# Altium footprint library ESKDPcbLib.PcbLib: 608 footprints (part 19 of 38)
Each footprint in its own frame and in the unit in brackets; x right, y up, seen from the top. Pads: shape width x height; smd on the part's side, far side on the other; paste and mask are expansions set on the pad; w line width, h text height; cw(c..) or ccw(c..) is an arc to the next point about the centre after c.
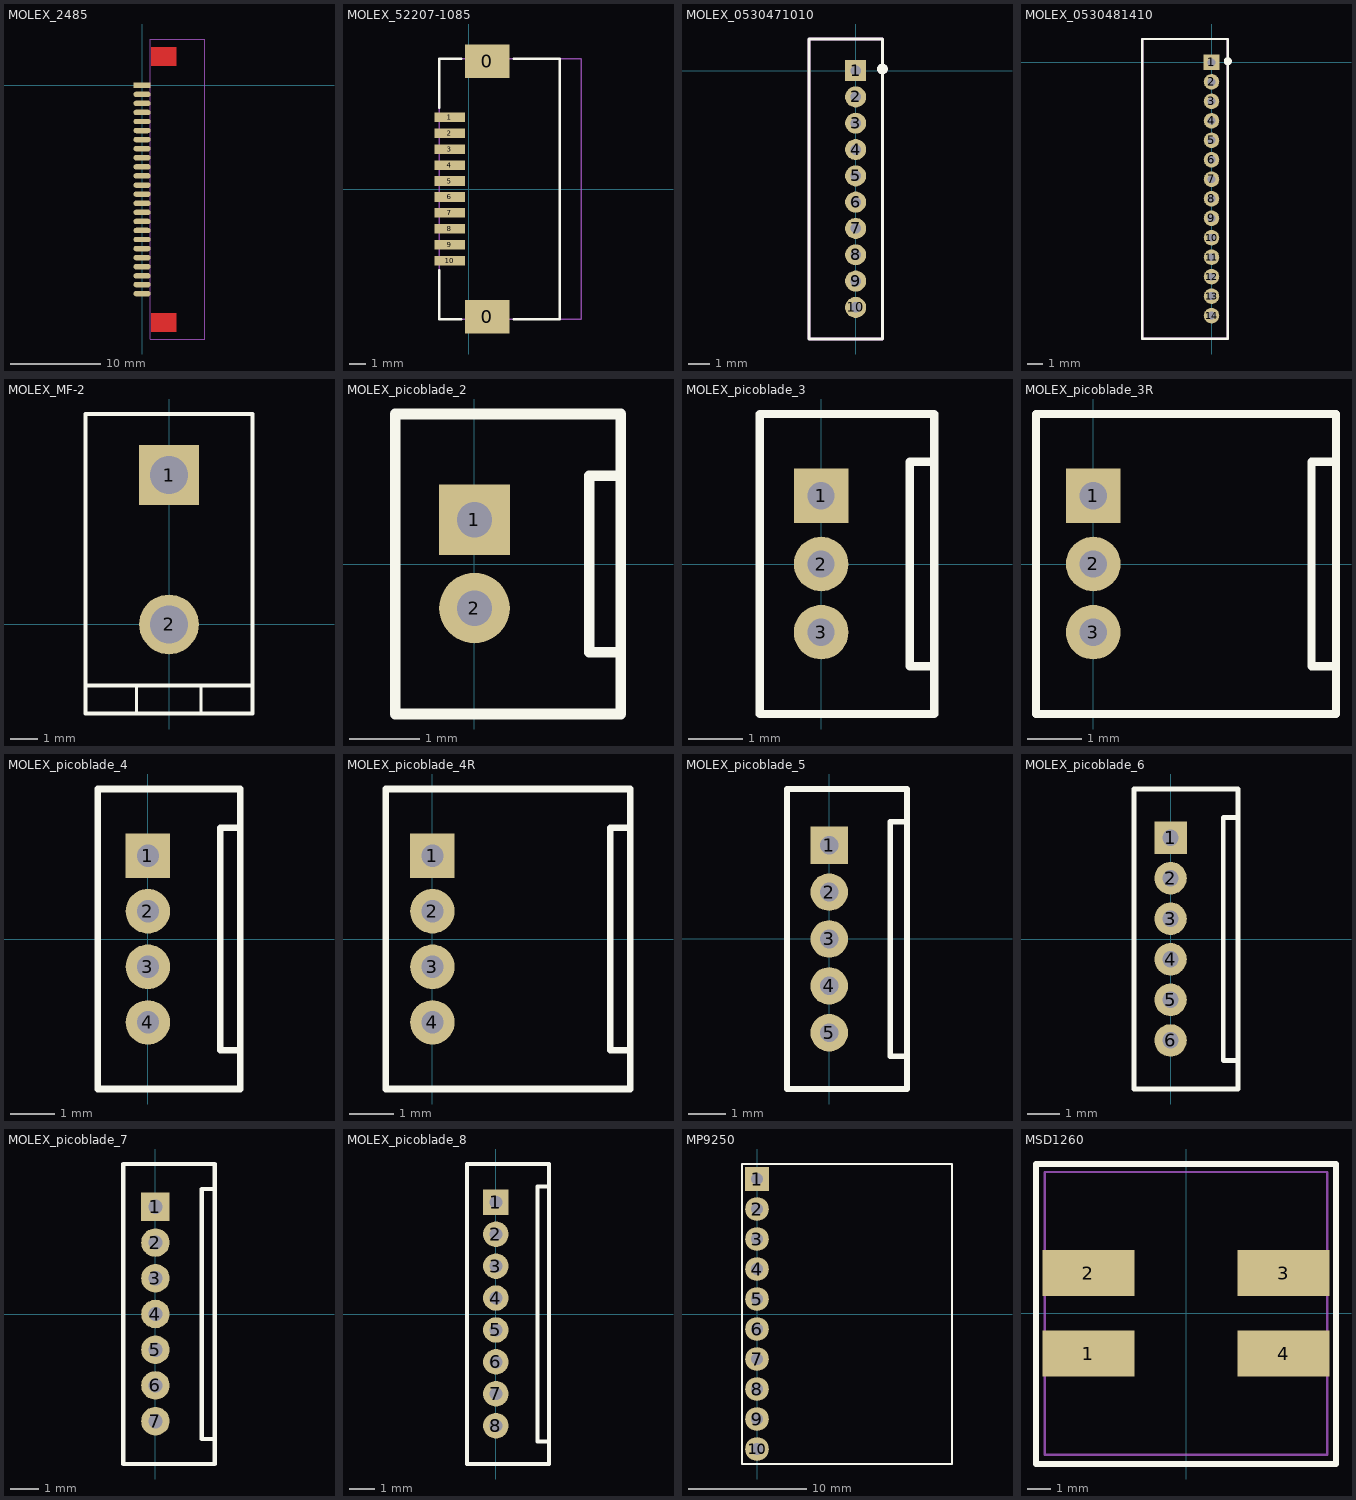
[diagram p18: the footprints below, top view; thin cyan lines are the x and y axes]

## MOLEX_2485 [mm]
pads (24):
  rect 1.9x0.6 smd: 1(0,0)
  oval 1.9x0.6 smd: 2(0,-1) 3(0,-2) 4(0,-3) 5(0,-4) 6(0,-5) 7(0,-6) 8(0,-7) 9(0,-8) 10(0,-9) 11(0,-10) 12(0,-11.025) 13(0,-12.025) 14(0,-13.025) 15(0,-14.025) 16(0,-15.025) 17(0,-16.025) 18(0,-17.025) 19(0,-18.025) 20(0,-19.025) 21(0,-20.025) 22(0,-21.025) 23(0,-22) 24(0,-23)
Top Layer:
  rectangle: 1,2.1 3.8,4.2
  rectangle: 1,-27.208 3.8,-25.108
Top Solder:
  rectangle: 0.9,2 3.9,4.3
  rectangle: 0.9,-27.308 3.9,-25.008
Mechanical 1:
  lines w0.1: 0.9,-28 0.9,5.1 6.9,5.1 6.9,-28 0.9,-28

## MOLEX_52207-1085 [mm]
height 2.7
pads (12):
  rect 2.8x2.1 smd: 0(1.175,-8) 0(1.175,8)
  rect 1.9x0.6 smd: 1(-1.175,4.5) 2(-1.175,3.5) 3(-1.175,2.5) 4(-1.175,1.5) 5(-1.175,0.5) 6(-1.175,-0.5) 7(-1.175,-1.5) 8(-1.175,-2.5) 9(-1.175,-3.5) 10(-1.175,-4.5)
Top Overlay:
  lines w0.15: -1.825,-5.075 -1.825,-8.15 -0.45,-8.15 ; -1.825,5.075 -1.825,8.15 -0.45,8.15 ; 2.825,-8.15 5.725,-8.15 5.725,8.15 2.825,8.15
Mechanical 7:
  lines w0.1: -1.825,-8.15 -1.825,8.15 7.075,8.15 7.075,-8.15 -1.825,-8.15
Mechanical 10:
  text ".Designator" at 0.795,10.18 h0.8
  text ".Comment" at 0.805,9.61 h0.6
3D body: height 2.69, standoff -0.01, extent -1.825,-8.15 7.075,8.15

## MOLEX_0530471010 [mm]
pads (10):
  rect 1x1 hole 0.5 mask+0.15: 1(0,0)
  round 1 hole 0.5 mask+0.15: 2(0,-1.25) 3(0,-2.5) 4(0,-3.75) 5(0,-5) 6(0,-6.25) 7(0,-7.5) 8(0,-8.75) 9(0,-10) 10(0,-11.25)
Top Overlay:
  circle w0.254: c1.273,0.075 r0.127
  lines w0.15: -2.225,-12.75 1.275,-12.75 1.275,1.5 -2.225,1.5 -2.225,-12.75
Mechanical 7:
  lines w0.15: -2.225,-12.75 1.275,-12.75 1.275,1.5 -2.225,1.5 -2.225,-12.75
3D body: height 4.25, standoff -2.25, extent -2.225,-12.75 1.275,1.5

## MOLEX_0530481410 [mm]
pads (14):
  rect 1x1 hole 0.5 mask+0.15: 1(0,0)
  round 1 hole 0.5 mask+0.15: 2(0,-1.25) 3(0,-2.5) 4(0,-3.75) 5(0,-5) 6(0,-6.25) 7(0,-7.5) 8(0,-8.75) 9(0,-10) 10(0,-11.25) 11(0,-12.5) 12(0,-13.75) 13(0,-15) 14(0,-16.25)
Top Overlay:
  circle w0.254: c1.048,0.075 r0.127
  lines w0.15: -4.45,-17.725 1.025,-17.725 1.05,-17.75 1.05,1.5 -4.45,1.5 -4.45,-17.725
Mechanical 7:
  lines w0.15: -4.45,-17.725 -4.45,1.5 1.05,1.5 1.05,-17.75 1.025,-17.725 -4.45,-17.725
3D body: height 3.5, standoff -2.4, extent -4.45,-17.75 1.05,1.5

## MOLEX_MF-2 [mm]
pads (2):
  rect 2.2x2.2 hole 1.4: 1(0,5.5)
  round 2.2 hole 1.4: 2(0,0)
Top Overlay:
  lines w0.1: -1.2,-3.275 -1.2,-2.25 ; 1.175,-3.275 1.175,-2.25 ; 1.2,-3.275 1.225,-3.3
  lines w0.15: -3.075,-2.25 3.075,-2.25 ; -3.075,-3.275 -3.075,7.75 3.075,7.75 3.075,-3.275 -3.075,-3.275
Mechanical 7:
  lines w0.1: -3.075,-2.25 3.075,-2.25 3.075,7.75 -3.075,7.75 -3.075,-2.25
Mechanical 10:
  text ".Comment" at -1.27,4.41 h0.6
  text ".Designator" at -1.28,4.98 h0.8
3D body: height 12.8, standoff -3.5, extent -3.1,-3.2 3.1,7.8

## MOLEX_picoblade_2 [mm]
height 4.2
pads (2):
  rect 1x1 hole 0.5 mask+0.15: 1(0,0.625)
  round 1 hole 0.5 mask+0.15: 2(0,-0.625)
Top Overlay:
  lines w0.15: 2.075,-1.25 1.625,-1.25 1.625,1.25 2.075,1.25 ; -1.125,-2.125 2.075,-2.125 2.075,2.125 -1.125,2.125 -1.125,-2.125
Mechanical 7:
  lines w0.1: 2.075,-1.25 1.625,-1.25 1.625,1.25 2.075,1.25 ; -1.125,-2.125 -1.125,2.125 2.075,2.125 2.075,-2.125 -1.125,-2.125
Mechanical 10:
  text ".Designator" at -0.78,3.055 h0.8
  text ".Comment" at -0.77,2.485 h0.6
3D body: height 4.22, standoff -2.18, extent -1.125,-2.125 2.075,2.125

## MOLEX_picoblade_3 [mm]
height 4.2
pads (3):
  rect 1x1 hole 0.5 mask+0.15: 1(0,1.25)
  round 1 hole 0.5 mask+0.15: 2(0,0) 3(0,-1.25)
Top Overlay:
  lines w0.15: 2.075,-1.875 1.625,-1.875 1.625,1.875 2.075,1.875 ; -1.125,-2.75 -1.125,2.75 2.075,2.75 2.075,-2.75 -1.125,-2.75
Mechanical 7:
  lines w0.1: 2.075,-1.875 1.625,-1.875 1.625,1.875 2.075,1.875 ; -1.125,-2.75 -1.125,2.75 2.075,2.75 2.075,-2.75 -1.125,-2.75
Mechanical 10:
  text ".Comment" at -0.77,3.11 h0.6
  text ".Designator" at -0.78,3.68 h0.8
3D body: height 4.22, standoff -2.18, extent -1.125,-2.75 2.075,2.75

## MOLEX_picoblade_3R [mm]
height 3.5
pads (3):
  rect 1x1 hole 0.5 mask+0.15: 1(0,1.25)
  round 1 hole 0.5 mask+0.15: 2(0,0) 3(0,-1.25)
Top Overlay:
  lines w0.15: 4.45,-1.875 4,-1.875 4,1.875 4.45,1.875 ; -1.05,-2.75 -1.05,2.75 4.45,2.75 4.45,-2.75 -1.05,-2.75
Mechanical 7:
  lines w0.1: 4.45,-1.875 4,-1.875 4,1.875 4.45,1.875 ; -1.05,-2.75 -1.05,2.75 4.45,2.75 4.45,-2.75 -1.05,-2.75
Mechanical 10:
  text ".Comment" at 0.605,3.16 h0.6
  text ".Designator" at 0.595,3.73 h0.8
3D body: height 3.51, standoff -2.29, extent -1.05,-2.75 4.45,2.75

## MOLEX_picoblade_4 [mm]
height 4.2
pads (4):
  rect 1x1 hole 0.5 mask+0.15: 1(0,1.875)
  round 1 hole 0.5 mask+0.15: 2(0,0.625) 3(0,-0.625) 4(0,-1.875)
Top Overlay:
  lines w0.15: 2.075,-2.5 1.625,-2.5 1.625,2.5 2.075,2.5 ; -1.125,-3.375 2.075,-3.375 2.075,3.375 -1.125,3.375 -1.125,-3.375
Mechanical 7:
  lines w0.1: 2.075,-2.5 1.625,-2.5 1.625,2.5 2.075,2.5 ; -1.125,-3.375 2.075,-3.375 2.075,3.375 -1.125,3.375 -1.125,-3.375
Mechanical 10:
  text ".Designator" at -0.78,4.305 h0.8
  text ".Comment" at -0.77,3.735 h0.6
3D body: height 4.22, standoff -2.18, extent -1.125,-3.375 2.075,3.375

## MOLEX_picoblade_4R [mm]
height 3.5
pads (4):
  rect 1x1 hole 0.5 mask+0.15: 1(0,1.875)
  round 1 hole 0.5 mask+0.15: 2(0,0.625) 3(0,-0.625) 4(0,-1.875)
Top Overlay:
  lines w0.15: 4.45,-2.5 4,-2.5 4,2.5 4.45,2.5 ; -1.05,-3.375 4.45,-3.375 4.45,3.375 -1.05,3.375 -1.05,-3.375
Mechanical 7:
  lines w0.1: 4.45,-2.5 4,-2.5 4,2.5 4.45,2.5 ; -1.05,-3.375 -1.05,3.375 4.45,3.375 4.45,-3.375 -1.05,-3.375
Mechanical 10:
  text ".Designator" at 0.595,4.355 h0.8
  text ".Comment" at 0.605,3.785 h0.6
3D body: height 3.51, standoff -2.29, extent -1.05,-3.375 4.45,3.375

## MOLEX_picoblade_5 [mm]
height 4.2
pads (5):
  rect 1x1 hole 0.5 mask+0.15: 1(0,2.5)
  round 1 hole 0.5 mask+0.15: 2(0,1.25) 3(0,0) 4(0,-1.25) 5(0,-2.5)
Top Overlay:
  lines w0.15: 2.075,-3.125 1.625,-3.125 1.625,3.125 2.075,3.125 ; -1.125,-4 -1.125,4 2.075,4 2.075,-4 -1.125,-4
Mechanical 7:
  lines w0.1: 2.075,-3.125 1.625,-3.125 1.625,3.125 2.075,3.125 ; -1.125,-4 -1.125,4 2.075,4 2.075,-4 -1.125,-4
Mechanical 10:
  text ".Comment" at -0.77,4.36 h0.6
  text ".Designator" at -0.78,4.93 h0.8
3D body: height 4.22, standoff -2.18, extent -1.125,-4 2.075,4

## MOLEX_picoblade_6 [mm]
height 4.2
pads (6):
  rect 1x1 hole 0.5 mask+0.15: 1(0,3.125)
  round 1 hole 0.5 mask+0.15: 2(0,1.875) 3(0,0.625) 4(0,-0.625) 5(0,-1.875) 6(0,-3.125)
Top Overlay:
  lines w0.15: 2.075,-3.75 1.625,-3.75 1.625,3.75 2.075,3.75 ; -1.125,-4.625 2.075,-4.625 2.075,4.625 -1.125,4.625 -1.125,-4.625
Mechanical 7:
  lines w0.1: 2.075,-3.75 1.625,-3.75 1.625,3.75 2.075,3.75 ; -1.125,-4.625 2.075,-4.625 2.075,4.625 -1.125,4.625 -1.125,-4.625
Mechanical 10:
  text ".Designator" at -0.78,5.555 h0.8
  text ".Comment" at -0.77,4.985 h0.6
3D body: height 4.22, standoff -2.18, extent -1.125,-4.625 2.075,4.625

## MOLEX_picoblade_7 [mm]
height 4.2
pads (7):
  rect 1x1 hole 0.5 mask+0.15: 1(0,3.75)
  round 1 hole 0.5 mask+0.15: 2(0,2.5) 3(0,1.25) 4(0,0) 5(0,-1.25) 6(0,-2.5) 7(0,-3.75)
Top Overlay:
  lines w0.15: 2.075,-4.375 1.625,-4.375 1.625,4.375 2.075,4.375 ; -1.125,-5.25 -1.125,5.25 2.075,5.25 2.075,-5.25 -1.125,-5.25
Mechanical 7:
  lines w0.1: 2.075,-4.375 1.625,-4.375 1.625,4.375 2.075,4.375 ; -1.125,-5.25 -1.125,5.25 2.075,5.25 2.075,-5.25 -1.125,-5.25
Mechanical 10:
  text ".Comment" at -0.77,5.61 h0.6
  text ".Designator" at -0.78,6.18 h0.8
3D body: height 4.22, standoff -2.18, extent -1.125,-5.25 2.075,5.25

## MOLEX_picoblade_8 [mm]
height 4.2
pads (8):
  rect 1x1 hole 0.5 mask+0.15: 1(0,4.375)
  round 1 hole 0.5 mask+0.15: 2(0,3.125) 3(0,1.875) 4(0,0.625) 5(0,-0.625) 6(0,-1.875) 7(0,-3.125) 8(0,-4.375)
Top Overlay:
  lines w0.15: 2.075,-5 1.625,-5 1.625,5 2.075,5 ; -1.125,-5.875 -1.125,5.875 2.075,5.875 2.075,-5.875 -1.125,-5.875
Mechanical 7:
  lines w0.1: 2.075,-5 1.625,-5 1.625,5 2.075,5 ; -1.125,-5.875 -1.125,5.875 2.075,5.875 2.075,-5.875 -1.125,-5.875
Mechanical 10:
  text ".Comment" at -0.77,6.235 h0.6
  text ".Designator" at -0.78,6.805 h0.8
3D body: height 4.22, standoff -2.18, extent -1.125,-5.875 2.075,5.875

## MP9250 [mm]
pads (10):
  rect 2x2 hole 1: 1(0,11.43)
  round 2 hole 1: 2(0,8.89) 3(0,6.35) 4(0,3.81) 5(0,1.27) 6(0,-1.27) 7(0,-3.81) 8(0,-6.35) 9(0,-8.89) 10(0,-11.43)
Top Overlay:
  lines w0.15: -1.27,-12.7 16.51,-12.7 16.51,12.7 -1.27,12.7 -1.27,-12.7
Mechanical 7:
  lines w0.1: -1.27,-12.7 -1.27,12.7 16.51,12.7 16.51,-12.7 -1.27,-12.7
Mechanical 10:
  text ".Comment" at -0.915,13.57 h1
  text ".Designator" at -0.915,14.57 h1
3D body "PLS-1.STEP": height 8.44, standoff -3, extent -1.27,-12.7 1.27,-10.16
3D body "PLS-1.STEP": height 8.44, standoff -3, extent -1.27,-10.16 1.27,-7.62
3D body "PLS-1.STEP": height 8.44, standoff -3, extent -1.27,-7.62 1.27,-5.08
3D body "PLS-1.STEP": height 8.44, standoff -3, extent -1.27,0 1.27,2.54
3D body "PLS-1.STEP": height 8.44, standoff -3, extent -1.27,-2.54 1.27,0
3D body "PLS-1.STEP": height 8.44, standoff -3, extent -1.27,-5.08 1.27,-2.54
3D body "PLS-1.STEP": height 8.44, standoff -3, extent -1.27,2.54 1.27,5.08
3D body "PLS-1.STEP": height 8.44, standoff -3, extent -1.27,10.16 1.27,12.7
3D body "PLS-1.STEP": height 8.44, standoff -3, extent -1.27,7.62 1.27,10.16
3D body "PLS-1.STEP": height 8.44, standoff -3, extent -1.27,5.08 1.27,7.62

## MSD1260 [mm]
height 6
pads (4):
  rect 4x2 smd mask+0.075: 1(-4.25,-1.75) 2(-4.25,1.75) 3(4.25,1.75) 4(4.25,-1.75)
Top Overlay:
  lines w0.254: -6.525,-6.55 6.525,-6.55 6.525,6.5 -6.525,6.5 -6.525,-6.55
Mechanical 7:
  lines w0.1: -6.15,-6.15 6.15,-6.15 6.15,6.15 -6.15,6.15 -6.15,-6.15
Mechanical 10:
  text ".Comment" at -1.4,7.725 h0.8
  text ".Designator" at -1.225,-7.75 h0.8
3D body: height 6, standoff 0, extent -6.15,-6.15 6.15,6.15